# Altium footprint library Connectors.PcbLib: 158 footprints (part 8 of 10)
Each footprint in its own frame and in the unit in brackets; x right, y up, seen from the top. Pads: shape width x height; smd on the part's side, far side on the other; paste and mask are expansions set on the pad; w line width, h text height; cw(c..) or ccw(c..) is an arc to the next point about the centre after c.
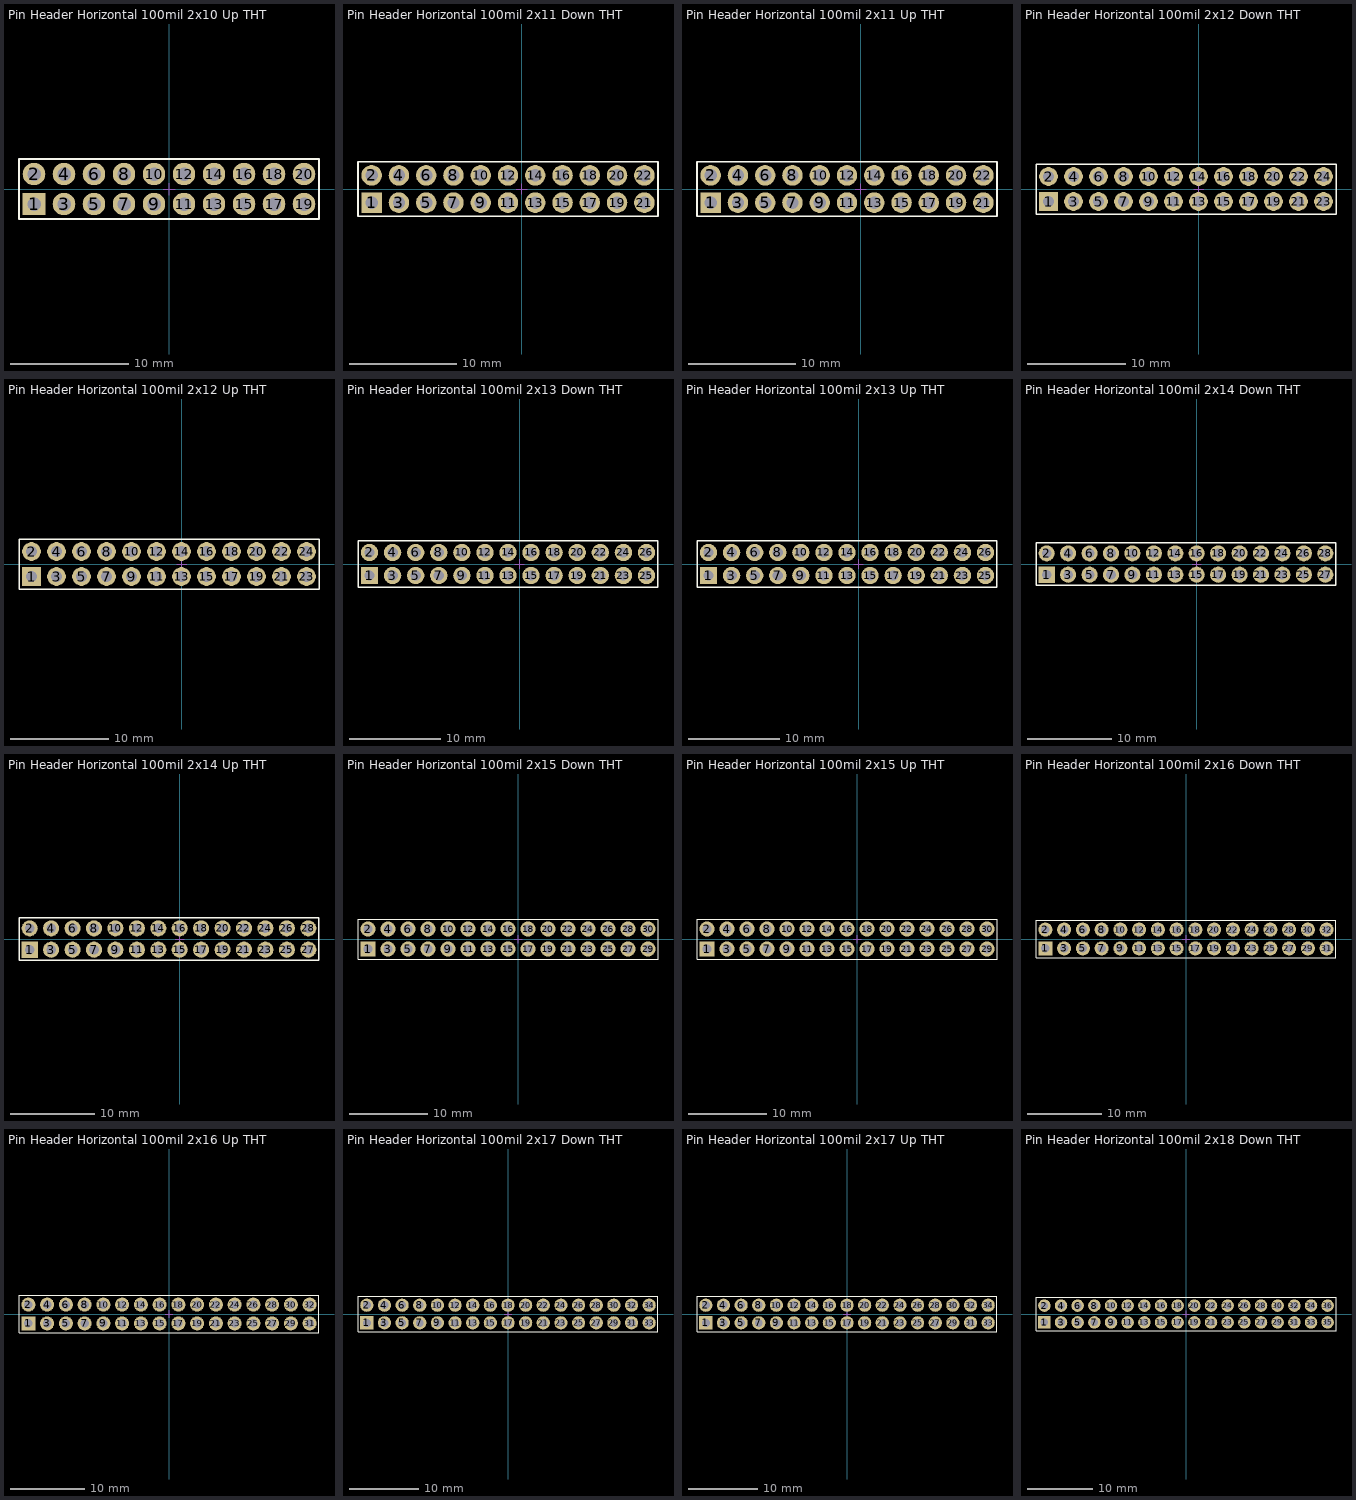
[diagram p7: the footprints below, top view; thin cyan lines are the x and y axes]

## Pin Header Horizontal 100mil 2x10 Up THT [mil]
pads (20):
  rect 75x75 hole 45: 1(-450,-50)
  round 75 hole 45: 2(-450,50) 3(-350,-50) 4(-350,50) 5(-250,-50) 6(-250,50) 7(-150,-50) 8(-150,50) 9(-50,-50) 10(-50,50) 11(50,-50) 12(50,50) 13(150,-50) 14(150,50) 15(250,-50) 16(250,50) 17(350,-50) 18(350,50) 19(450,-50) 20(450,50)
Top Overlay:
  lines w6: -500,-100 500,-100 500,100 -500,100 -500,-100
Mechanical 15:
  lines w4: -20,0 20,0 ; 0,-20 0,20
3D body "pin_header_horizontal_100mil_2x10_THT.stp": height 201, standoff -117.11, extent -500,-60 500,447.88

## Pin Header Horizontal 100mil 2x11 Down THT [mil]
pads (22):
  rect 75x75 hole 45: 1(-550,-50)
  round 75 hole 45: 2(-550,50) 3(-450,-50) 4(-450,50) 5(-350,-50) 6(-350,50) 7(-250,-50) 8(-250,50) 9(-150,-50) 10(-150,50) 11(-50,-50) 12(-50,50) 13(50,-50) 14(50,50) 15(150,-50) 16(150,50) 17(250,-50) 18(250,50) 19(350,-50) 20(350,50) 21(450,-50) 22(450,50)
Top Overlay:
  lines w6: -600,-100 500,-100 500,100 -600,100 -600,-100
Mechanical 15:
  lines w4: -20,0 20,0 ; 0,-20 0,20
3D body "pin_header_horizontal_100mil_2x11_THT.stp": height 201, standoff -117.11, extent -600,-446.22 500,61.65

## Pin Header Horizontal 100mil 2x11 Up THT [mil]
pads (22):
  rect 75x75 hole 45: 1(-550,-50)
  round 75 hole 45: 2(-550,50) 3(-450,-50) 4(-450,50) 5(-350,-50) 6(-350,50) 7(-250,-50) 8(-250,50) 9(-150,-50) 10(-150,50) 11(-50,-50) 12(-50,50) 13(50,-50) 14(50,50) 15(150,-50) 16(150,50) 17(250,-50) 18(250,50) 19(350,-50) 20(350,50) 21(450,-50) 22(450,50)
Top Overlay:
  lines w6: -600,-100 -600,100 500,100 500,-100 -600,-100
Mechanical 15:
  lines w4: -20,0 20,0 ; 0,-20 0,20
3D body "pin_header_horizontal_100mil_2x11_THT.stp": height 201, standoff -117.11, extent -599.99,-61.65 500.01,446.23

## Pin Header Horizontal 100mil 2x12 Down THT [mil]
pads (24):
  rect 75x75 hole 45: 1(-600,-50)
  round 75 hole 45: 2(-600,50) 3(-500,-50) 4(-500,50) 5(-400,-50) 6(-400,50) 7(-300,-50) 8(-300,50) 9(-200,-50) 10(-200,50) 11(-100,-50) 12(-100,50) 13(0,-50) 14(0,50) 15(100,-50) 16(100,50) 17(200,-50) 18(200,50) 19(300,-50) 20(300,50) 21(400,-50) 22(400,50) 23(500,-50) 24(500,50)
Top Overlay:
  lines w6: -650,-100 550,-100 550,100 -650,100 -650,-100
Mechanical 15:
  lines w4: -20,0 20,0 ; 0,-20 0,20
3D body "pin_header_horizontal_100mil_2x12_THT.stp": height 201, standoff -117.11, extent -650,-446.22 550,61.65

## Pin Header Horizontal 100mil 2x12 Up THT [mil]
pads (24):
  rect 75x75 hole 45: 1(-600,-50)
  round 75 hole 45: 2(-600,50) 3(-500,-50) 4(-500,50) 5(-400,-50) 6(-400,50) 7(-300,-50) 8(-300,50) 9(-200,-50) 10(-200,50) 11(-100,-50) 12(-100,50) 13(0,-50) 14(0,50) 15(100,-50) 16(100,50) 17(200,-50) 18(200,50) 19(300,-50) 20(300,50) 21(400,-50) 22(400,50) 23(500,-50) 24(500,50)
Top Overlay:
  lines w6: -650,-100 -650,100 550,100 550,-100 -650,-100
Mechanical 15:
  lines w4: -20,0 20,0 ; 0,-20 0,20
3D body "pin_header_horizontal_100mil_2x12_THT.stp": height 201, standoff -117.11, extent -649.99,-61.65 550.01,446.23

## Pin Header Horizontal 100mil 2x13 Down THT [mil]
pads (26):
  rect 75x75 hole 45: 1(-650,-50)
  round 75 hole 45: 2(-650,50) 3(-550,-50) 4(-550,50) 5(-450,-50) 6(-450,50) 7(-350,-50) 8(-350,50) 9(-250,-50) 10(-250,50) 11(-150,-50) 12(-150,50) 13(-50,-50) 14(-50,50) 15(50,-50) 16(50,50) 17(150,-50) 18(150,50) 19(250,-50) 20(250,50) 21(350,-50) 22(350,50) 23(450,-50) 24(450,50) 25(550,-50) 26(550,50)
Top Overlay:
  lines w6: -700,-100 600,-100 600,100 -700,100 -700,-100
Mechanical 15:
  lines w4: -20,0 20,0 ; 0,-20 0,20
3D body "pin_header_horizontal_100mil_2x2_THT.stp": height 201, standoff -117.11, extent 400,-447.88 600,60
3D body "pin_header_horizontal_100mil_2x11_THT.stp": height 201, standoff -117.11, extent -700,-447.88 400,60

## Pin Header Horizontal 100mil 2x13 Up THT [mil]
pads (26):
  rect 75x75 hole 45: 1(-650,-50)
  round 75 hole 45: 2(-650,50) 3(-550,-50) 4(-550,50) 5(-450,-50) 6(-450,50) 7(-350,-50) 8(-350,50) 9(-250,-50) 10(-250,50) 11(-150,-50) 12(-150,50) 13(-50,-50) 14(-50,50) 15(50,-50) 16(50,50) 17(150,-50) 18(150,50) 19(250,-50) 20(250,50) 21(350,-50) 22(350,50) 23(450,-50) 24(450,50) 25(550,-50) 26(550,50)
Top Overlay:
  lines w6: -700,-100 -700,100 600,100 600,-100 -700,-100
Mechanical 15:
  lines w4: -20,0 20,0 ; 0,-20 0,20
3D body "pin_header_horizontal_100mil_2x2_THT.stp": height 201, standoff -117.11, extent 400.01,-61.65 600.01,446.23
3D body "pin_header_horizontal_100mil_2x11_THT.stp": height 201, standoff -117.11, extent -699.99,-61.65 400.01,446.23

## Pin Header Horizontal 100mil 2x14 Down THT [mil]
pads (28):
  rect 75x75 hole 45: 1(-700,-50)
  round 75 hole 45: 2(-700,50) 3(-600,-50) 4(-600,50) 5(-500,-50) 6(-500,50) 7(-400,-50) 8(-400,50) 9(-300,-50) 10(-300,50) 11(-200,-50) 12(-200,50) 13(-100,-50) 14(-100,50) 15(0,-50) 16(0,50) 17(100,-50) 18(100,50) 19(200,-50) 20(200,50) 21(300,-50) 22(300,50) 23(400,-50) 24(400,50) 25(500,-50) 26(500,50) 27(600,-50) 28(600,50)
Top Overlay:
  lines w6: -750,-100 650,-100 650,100 -750,100 -750,-100
Mechanical 15:
  lines w4: -20,0 20,0 ; 0,-20 0,20
3D body "pin_header_horizontal_100mil_2x12_THT.stp": height 201, standoff -117.11, extent -750,-446.22 450,61.65
3D body "pin_header_horizontal_100mil_2x2_THT.stp": height 201, standoff -117.11, extent 450,-446.22 650,61.65

## Pin Header Horizontal 100mil 2x14 Up THT [mil]
pads (28):
  rect 75x75 hole 45: 1(-700,-50)
  round 75 hole 45: 2(-700,50) 3(-600,-50) 4(-600,50) 5(-500,-50) 6(-500,50) 7(-400,-50) 8(-400,50) 9(-300,-50) 10(-300,50) 11(-200,-50) 12(-200,50) 13(-100,-50) 14(-100,50) 15(0,-50) 16(0,50) 17(100,-50) 18(100,50) 19(200,-50) 20(200,50) 21(300,-50) 22(300,50) 23(400,-50) 24(400,50) 25(500,-50) 26(500,50) 27(600,-50) 28(600,50)
Top Overlay:
  lines w6: -750,-100 650,-100 650,100 -750,100 -750,-100
Mechanical 15:
  lines w4: -20,0 20,0 ; 0,-20 0,20
3D body "pin_header_horizontal_100mil_2x12_THT.stp": height 201, standoff -117.11, extent -749.99,-61.65 450.01,446.23
3D body "pin_header_horizontal_100mil_2x2_THT.stp": height 201, standoff -117.11, extent 450.01,-61.65 650.01,446.23

## Pin Header Horizontal 100mil 2x15 Down THT [mil]
pads (30):
  rect 75x75 hole 45: 1(-750,-50)
  round 75 hole 45: 2(-750,50) 3(-650,-50) 4(-650,50) 5(-550,-50) 6(-550,50) 7(-450,-50) 8(-450,50) 9(-350,-50) 10(-350,50) 11(-250,-50) 12(-250,50) 13(-150,-50) 14(-150,50) 15(-50,-50) 16(-50,50) 17(50,-50) 18(50,50) 19(150,-50) 20(150,50) 21(250,-50) 22(250,50) 23(350,-50) 24(350,50) 25(450,-50) 26(450,50) 27(550,-50) 28(550,50) 29(650,-50) 30(650,50)
Top Overlay:
  lines w6: -800,-100 700,-100 700,100 -800,100 -800,-100
Mechanical 15:
  lines w4: -20,0 20,0 ; 0,-20 0,20
3D body "pin_header_horizontal_100mil_2x12_THT.stp": height 201, standoff -117.11, extent -800,-443.94 400,63.94
3D body "pin_header_horizontal_100mil_2x3_THT.stp": height 201, standoff -117.11, extent 400,-443.94 700,63.94

## Pin Header Horizontal 100mil 2x15 Up THT [mil]
pads (30):
  rect 75x75 hole 45: 1(-750,-50)
  round 75 hole 45: 2(-750,50) 3(-650,-50) 4(-650,50) 5(-550,-50) 6(-550,50) 7(-450,-50) 8(-450,50) 9(-350,-50) 10(-350,50) 11(-250,-50) 12(-250,50) 13(-150,-50) 14(-150,50) 15(-50,-50) 16(-50,50) 17(50,-50) 18(50,50) 19(150,-50) 20(150,50) 21(250,-50) 22(250,50) 23(350,-50) 24(350,50) 25(450,-50) 26(450,50) 27(550,-50) 28(550,50) 29(650,-50) 30(650,50)
Top Overlay:
  lines w6: -800,-100 -800,100 700,100 700,-100 -800,-100
Mechanical 15:
  lines w4: -20,0 20,0 ; 0,-20 0,20
3D body "pin_header_horizontal_100mil_2x12_THT.stp": height 201, standoff -117.11, extent -800,-63.94 400,443.94
3D body "pin_header_horizontal_100mil_2x3_THT.stp": height 201, standoff -117.11, extent 400.01,-61.65 700.01,446.23

## Pin Header Horizontal 100mil 2x16 Down THT [mil]
pads (32):
  rect 75x75 hole 45: 1(-750,-50)
  round 75 hole 45: 2(-750,50) 3(-650,-50) 4(-650,50) 5(-550,-50) 6(-550,50) 7(-450,-50) 8(-450,50) 9(-350,-50) 10(-350,50) 11(-250,-50) 12(-250,50) 13(-150,-50) 14(-150,50) 15(-50,-50) 16(-50,50) 17(50,-50) 18(50,50) 19(150,-50) 20(150,50) 21(250,-50) 22(250,50) 23(350,-50) 24(350,50) 25(450,-50) 26(450,50) 27(550,-50) 28(550,50) 29(650,-50) 30(650,50) 31(750,-50) 32(750,50)
Top Overlay:
  lines w6: -800,-100 800,-100 800,100 -800,100 -800,-100
Mechanical 15:
  lines w4: -20,0 20,0 ; 0,-20 0,20
3D body "pin_header_horizontal_100mil_2x16_THT.stp": height 201, standoff -117.11, extent -800,-446.22 800,61.65

## Pin Header Horizontal 100mil 2x16 Up THT [mil]
pads (32):
  rect 75x75 hole 45: 1(-750,-50)
  round 75 hole 45: 2(-750,50) 3(-650,-50) 4(-650,50) 5(-550,-50) 6(-550,50) 7(-450,-50) 8(-450,50) 9(-350,-50) 10(-350,50) 11(-250,-50) 12(-250,50) 13(-150,-50) 14(-150,50) 15(-50,-50) 16(-50,50) 17(50,-50) 18(50,50) 19(150,-50) 20(150,50) 21(250,-50) 22(250,50) 23(350,-50) 24(350,50) 25(450,-50) 26(450,50) 27(550,-50) 28(550,50) 29(650,-50) 30(650,50) 31(750,-50) 32(750,50)
Top Overlay:
  lines w6: -800,-100 800,-100 800,100 -800,100 -800,-100
Mechanical 15:
  lines w4: -20,0 20,0 ; 0,-20 0,20
3D body "pin_header_horizontal_100mil_2x16_THT.stp": height 201, standoff -117.11, extent -800,-60 800,447.88

## Pin Header Horizontal 100mil 2x17 Down THT [mil]
pads (34):
  rect 75x75 hole 45: 1(-800,-50)
  round 75 hole 45: 2(-800,50) 3(-700,-50) 4(-700,50) 5(-600,-50) 6(-600,50) 7(-500,-50) 8(-500,50) 9(-400,-50) 10(-400,50) 11(-300,-50) 12(-300,50) 13(-200,-50) 14(-200,50) 15(-100,-50) 16(-100,50) 17(0,-50) 18(0,50) 19(100,-50) 20(100,50) 21(200,-50) 22(200,50) 23(300,-50) 24(300,50) 25(400,-50) 26(400,50) 27(500,-50) 28(500,50) 29(600,-50) 30(600,50) 31(700,-50) 32(700,50) 33(800,-50) 34(800,50)
Top Overlay:
  lines w6: -850,-100 850,-100 850,100 -850,100 -850,-100
Mechanical 15:
  lines w4: -20,0 20,0 ; 0,-20 0,20
3D body "pin_header_horizontal_100mil_2x17_THT.stp": height 201, standoff -117.11, extent -850,-446.22 850,61.65

## Pin Header Horizontal 100mil 2x17 Up THT [mil]
pads (34):
  rect 75x75 hole 45: 1(-800,-50)
  round 75 hole 45: 2(-800,50) 3(-700,-50) 4(-700,50) 5(-600,-50) 6(-600,50) 7(-500,-50) 8(-500,50) 9(-400,-50) 10(-400,50) 11(-300,-50) 12(-300,50) 13(-200,-50) 14(-200,50) 15(-100,-50) 16(-100,50) 17(0,-50) 18(0,50) 19(100,-50) 20(100,50) 21(200,-50) 22(200,50) 23(300,-50) 24(300,50) 25(400,-50) 26(400,50) 27(500,-50) 28(500,50) 29(600,-50) 30(600,50) 31(700,-50) 32(700,50) 33(800,-50) 34(800,50)
Top Overlay:
  lines w6: -850,-100 -850,100 850,100 850,-100 -850,-100
Mechanical 15:
  lines w4: -20,0 20,0 ; 0,-20 0,20
3D body "pin_header_horizontal_100mil_2x17_THT.stp": height 201, standoff -117.11, extent -849.99,-61.65 850.01,446.23

## Pin Header Horizontal 100mil 2x18 Down THT [mil]
pads (36):
  rect 75x75 hole 45: 1(-850,-50)
  round 75 hole 45: 2(-850,50) 3(-750,-50) 4(-750,50) 5(-650,-50) 6(-650,50) 7(-550,-50) 8(-550,50) 9(-450,-50) 10(-450,50) 11(-350,-50) 12(-350,50) 13(-250,-50) 14(-250,50) 15(-150,-50) 16(-150,50) 17(-50,-50) 18(-50,50) 19(50,-50) 20(50,50) 21(150,-50) 22(150,50) 23(250,-50) 24(250,50) 25(350,-50) 26(350,50) 27(450,-50) 28(450,50) 29(550,-50) 30(550,50) 31(650,-50) 32(650,50) 33(750,-50) 34(750,50) 35(850,-50) 36(850,50)
Top Overlay:
  lines w6: -900,-100 -900,100 900,100 900,-100 -900,-100
Mechanical 15:
  lines w4: -20,0 20,0 ; 0,-20 0,20
3D body "pin_header_horizontal_100mil_2x18_THT.stp": height 201, standoff -117.11, extent -900,-446.22 900,61.65